# Altium footprint library Elements_LT.PcbLib: 145 footprints (part 3 of 10)
Each footprint in its own frame and in the unit in brackets; x right, y up, seen from the top. Pads: shape width x height; smd on the part's side, far side on the other; paste and mask are expansions set on the pad; w line width, h text height; cw(c..) or ccw(c..) is an arc to the next point about the centre after c.
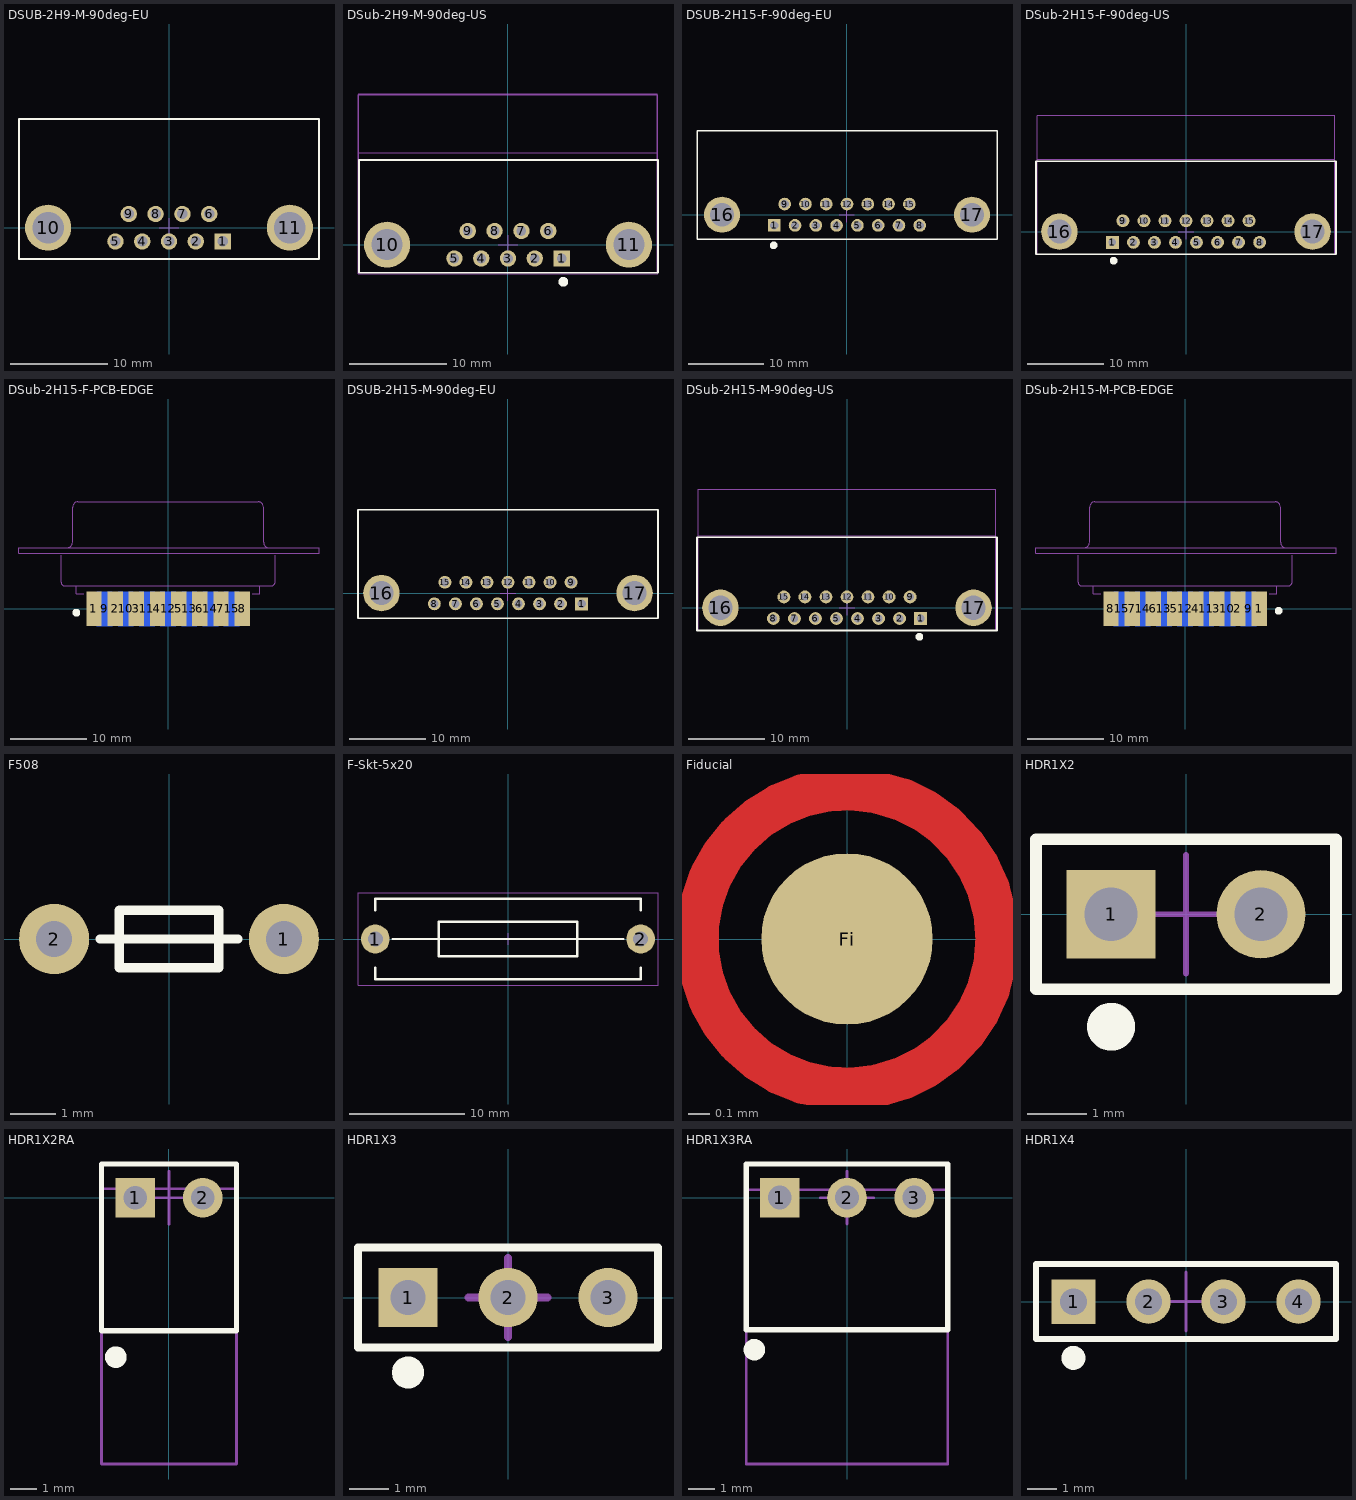
[diagram p2: the footprints below, top view; thin cyan lines are the x and y axes]

## DSUB-2H9-M-90deg-EU [mm] "Connector; D Subminiature; 9 Position; Right Angle; Pitch 1.385 mm; Male; EU"
height 12.75
pads (11):
  rect 1.69x1.69 hole 1.09: 1(5.54,-1.42)
  round 1.69 hole 1.09: 2(2.77,-1.42) 3(0,-1.42) 4(-2.77,-1.42) 5(-5.54,-1.42) 6(4.155,1.42) 7(1.385,1.42) 8(-1.385,1.42) 9(-4.155,1.42)
  round 4.76 hole 3.26: 10(-12.495,0) 11(12.495,0)
Top Overlay:
  lines w0.2: -15.5,-3.25 -15.5,11.25 15.5,11.25 15.5,-3.25 -15.5,-3.25
Mechanical 15:
  lines w0.1: -1,0 1,0 ; 0,-1 0,1
3D body "anschluss_a-ds_09_a_kg-t1.stp": height 12.56, standoff -4.31, extent -15.405,-3.1 15.405,17.8

## DSub-2H9-M-90deg-US [mm] "Connector; D Subminiature; 9 Position; Right Angle; Pitch 1.385 mm; Male; US"
height 12.75
pads (11):
  rect 1.69x1.69 hole 1: 1(5.54,-1.42)
  round 1.69 hole 1: 2(2.77,-1.42) 3(0,-1.42) 4(-2.77,-1.42) 5(-5.54,-1.42) 6(4.155,1.42) 7(1.385,1.42) 8(-1.385,1.42) 9(-4.155,1.42)
  round 4.76 hole 3.2: 10(-12.495,0) 11(12.495,0)
Top Overlay:
  circle w0.508: c5.715,-3.835 r0.254
  lines w0.2: -15.4,-2.9 15.5,-2.9 15.5,8.75 -15.4,8.75 -15.4,-2.9
Mechanical 13:
  lines w0.05: -15.405,-3 15.405,-3 15.405,15.6 -15.405,15.6 -15.405,-3
  lines w0.1: -15.405,9.5 15.405,9.5
Mechanical 15:
  lines w0.05: -15.5,-3 -15.5,15.5 15.5,15.5 15.5,-3 -15.5,-3
  lines w0.1: -1,0 1,0 ; 0,-1 0,1
3D body "anschluss_a-ds_09_a_kg-t2.stp": height 12.56, standoff -4.31, extent -15.405,-3 15.405,15.6

## DSUB-2H15-F-90deg-EU [mm] "Connector; D Subminiature; 15 Position; Right Angle; Pitch 1.385 mm; Female; EU"
height 12.75
pads (17):
  rect 1.69x1.69 hole 1.09: 1(-9.695,-1.42)
  round 1.69 hole 1.09: 2(-6.925,-1.42) 3(-4.155,-1.42) 4(-1.385,-1.42) 5(1.385,-1.42) 6(4.155,-1.42) 7(6.925,-1.42) 8(9.695,-1.42) 9(-8.31,1.42) 10(-5.54,1.42) 11(-2.77,1.42) 12(0,1.42) 13(2.77,1.42) 14(5.54,1.42) 15(8.31,1.42)
  round 4.8 hole 3.18: 16(-16.66,0) 17(16.66,0)
Top Overlay:
  circle w0.508: c-9.775,-4.085 r0.254
  lines w0.2: -20,-3.3 -20,11.2 20,11.2 20,-3.3 -20,-3.3
Mechanical 15:
  lines w0.1: -1,0 1,0 ; 0,-1 0,1
3D body "anschluss_a-df_15_a_kg-t1.stp": height 12.56, standoff -4.31, extent -19.57,-3.1 19.57,17.7

## DSub-2H15-F-90deg-US [mm] "Connector; D Subminiature; 15 Position; Right Angle; Pitch 1.385 mm; Female; US"
height 12.75
pads (17):
  rect 1.69x1.69 hole 1: 1(-9.695,-1.42)
  round 1.69 hole 1: 2(-6.925,-1.42) 3(-4.155,-1.42) 4(-1.385,-1.42) 5(1.385,-1.42) 6(4.155,-1.42) 7(6.925,-1.42) 8(9.695,-1.42) 9(-8.31,1.42) 10(-5.54,1.42) 11(-2.77,1.42) 12(0,1.42) 13(2.77,1.42) 14(5.54,1.42) 15(8.31,1.42)
  round 4.8 hole 3.2: 16(-16.66,0) 17(16.66,0)
Top Overlay:
  circle w0.508: c-9.525,-3.835 r0.254
  lines w0.2: -19.75,-3 -19.75,9.25 19.75,9.25 19.75,-3 -19.75,-3
Mechanical 13:
  lines w0.05: -19.57,15.23 -19.57,-3 19.57,-3 19.57,15.3 -19.57,15.3
  lines w0.1: -19.57,9.5 19.57,9.5 ; -19.57,15.23 -19.5,15.3
Mechanical 15:
  lines w0.1: -1,0 1,0 ; 0,-1 0,1
3D body "anschluss_a-df_15_a_kg-t2.stp": height 12.56, standoff -4.31, extent -19.57,-3 19.57,15.3

## DSub-2H15-F-PCB-EDGE [mm] "Connector; D Subminiature; 15 Position; PCB edge mount"
height 12.5
pads (15):
  rect 2x4.5 smd: 1(-9.695,0) 2(-6.925,0) 3(-4.155,0) 4(-1.385,0) 5(1.385,0) 6(4.155,0) 7(6.925,0) 8(9.695,0)
  rect 2x4.5 smd far side: 9(-8.31,0) 10(-5.54,0) 11(-2.77,0) 12(0,0) 13(2.77,0) 14(5.54,0) 15(8.31,0)
Top Overlay:
  circle w0.508: c-12,-0.5 r0.254
Mechanical 13:
  lines w0.1: -14,7 -14,3.5 ccw(c-13.5,3.5) -13.5,3 -12,3 ; -13.195,8.005 ccw(c-13.195,8.7) -12.5,8.7 -12.5,13.3 ; -12.495,13.305 cw(c-11.8,13.305) -11.8,14 11.8,14 cw(c11.8,13.305) 12.495,13.305 ; -11,2 -12,2 -12,3 ; 11,2 12,2 12,3 ; 12.5,13.3 12.5,8.7 ccw(c13.195,8.7) 13.195,8.005 ; 13.5,3 ccw(c13.5,3.5) 14,3.5 14,7 ; 13.506,3 12,3 ; -12,3 12,3 ; -19.5,7.25 19.75,7.25 19.75,8 -19.5,8 -19.5,7.25
Mechanical 15:
  lines w0.1: -1,0 1,0 ; 0,-1 0,1
3D body "c-5-747909-2-v-3d.stp": height 5.45, standoff -7.05, extent -19.7,-1 19.5,13.9

## DSUB-2H15-M-90deg-EU [mm] "Connector; D Subminiature; 15 Position; Right Angle; Pitch 1.385 mm; Male; EU"
height 12.75
pads (17):
  rect 1.69x1.69 hole 1.09: 1(9.695,-1.42)
  round 1.69 hole 1.09: 2(6.925,-1.42) 3(4.155,-1.42) 4(1.385,-1.42) 5(-1.385,-1.42) 6(-4.155,-1.42) 7(-6.925,-1.42) 8(-9.695,-1.42) 9(8.31,1.42) 10(5.54,1.42) 11(2.77,1.42) 12(0,1.42) 13(-2.77,1.42) 14(-5.54,1.42) 15(-8.31,1.42)
  round 4.8 hole 3.18: 16(-16.66,0) 17(16.66,0)
Top Overlay:
  lines w0.2: -19.75,-3.3 19.75,-3.3 19.75,10.95 -19.75,10.95 -19.75,-3.3
Mechanical 15:
  lines w0.1: -1,0 1,0 ; 0,-1 0,1
3D body "anschluss_a-ds_15_a_kg-t1.stp": height 12.56, standoff -4.31, extent -19.57,-3.1 19.57,17.8

## DSub-2H15-M-90deg-US [mm] "Connector; D Subminiature; 15 Position; Right Angle; Pitch 1.385 mm; Male; US"
height 12.75
pads (17):
  rect 1.69x1.69 hole 1: 1(9.695,-1.42)
  round 1.69 hole 1: 2(6.925,-1.42) 3(4.155,-1.42) 4(1.385,-1.42) 5(-1.385,-1.42) 6(-4.155,-1.42) 7(-6.925,-1.42) 8(-9.695,-1.42) 9(8.31,1.42) 10(5.54,1.42) 11(2.77,1.42) 12(0,1.42) 13(-2.77,1.42) 14(-5.54,1.42) 15(-8.31,1.42)
  round 4.8 hole 3.2: 16(-16.66,0) 17(16.66,0)
Top Overlay:
  circle w0.508: c9.525,-3.835 r0.254
  lines w0.2: -19.75,-3 -19.75,9.25 19.75,9.25 19.75,-3 -19.75,-3
Mechanical 13:
  lines w0.05: -19.57,-3 19.57,-3 19.57,15.6 -19.57,15.6 -19.57,-3
  lines w0.1: -19.57,9.5 19.57,9.5
Mechanical 15:
  lines w0.1: -1,0 1,0 ; 0,-1 0,1
3D body "anschluss_a-ds_15_a_kg-t2.stp": height 12.56, standoff -4.31, extent -19.57,-3 19.57,15.6

## DSub-2H15-M-PCB-EDGE [mm] "Connector; D Subminiature; 15 Position; PCB edge mount"
height 12.5
pads (15):
  rect 2x4.5 smd: 1(9.695,0) 2(6.925,0) 3(4.155,0) 4(1.385,0) 5(-1.385,0) 6(-4.155,0) 7(-6.925,0) 8(-9.695,0)
  rect 2x4.5 smd far side: 9(8.31,0) 10(5.54,0) 11(2.77,0) 12(0,0) 13(-2.77,0) 14(-5.54,0) 15(-8.31,0)
Top Overlay:
  circle w0.508: c12.25,-0.25 r0.254
Mechanical 13:
  lines w0.1: -14,7 -14,3.5 ccw(c-13.5,3.5) -13.5,3 -12,3 ; -13.195,8.005 ccw(c-13.195,8.7) -12.5,8.7 -12.5,13.3 ; -12.495,13.305 cw(c-11.8,13.305) -11.8,14 11.8,14 cw(c11.8,13.305) 12.495,13.305 ; -11,2 -12,2 -12,3 ; 11,2 12,2 12,3 ; 12.5,13.3 12.5,8.7 ccw(c13.195,8.7) 13.195,8.005 ; 13.5,3 ccw(c13.5,3.5) 14,3.5 14,7 ; 13.506,3 12,3 ; -12,3 12,3 ; -19.5,7.25 -19.5,8 19.75,8 19.75,7.25 -19.5,7.25
Mechanical 15:
  lines w0.1: -1,0 1,0 ; 0,-1 0,1
3D body "c-5-747908-2-w-3d.stp": height 5.45, standoff -7.05, extent -19.45,-1.225 19.75,14.225

## F508 [mm] "Fuse, THT, Pitch 5.08mm"
pads (2):
  round 1.55 hole 0.8 paste+0.025 mask+0.07: 1(2.54,0) 2(-2.54,0)
Top Overlay:
  lines w0.2: -1.524,0 1.524,0 ; -1.1,-0.635 1.1,-0.635 1.1,0.635 -1.1,0.635 -1.1,-0.635
3D body "User Library-CAP CERAMICO.STEP": height 4.8, standoff -0.68, extent -2.68,-1.041 2.68,1.059

## F-Skt-5x20 [mm] "Socket, THT, for fuse 5x20 mm"
height 12.7
pads (2):
  round 2.5 hole 1.3 paste+0.025 mask+0.07: 1(-11.5,0) 2(11.5,0)
Top Overlay:
  lines w0.2: -11.5,-2.5 -11.5,-3.5 11.5,-3.5 11.5,-2.5 ; -11.5,2.5 -11.5,3.5 11.5,3.5 11.5,2.5 ; -10,0 10,0 ; -6,-1.5 -6,1.5 6,1.5 6,-1.5 -6,-1.5
Mechanical 15:
  lines w0.05: -13,-4 -13,4 13,4 13,-4 -13,-4
  lines w0.1: -0.5,0 0.5,0 ; 0,-0.5 0,0.5
3D body: height 12.7, standoff 0, extent -11.5,-4 11.5,4

## Fiducial [mm] "Fiducial"
pads (1):
  round 0.8 smd: Fi(0,0)
Top Layer:
  circle w0.2: c0,0 r0.7

## HDR1X2 [mm] "Connector; Header; 2 Position"
pads (2):
  rect 1.5x1.5 hole 0.9: 1(-1.27,0)
  round 1.5 hole 0.9: 2(1.27,0)
Top Overlay:
  circle w0.406: c-1.27,-1.905 r0.203
  lines w0.2: -2.54,-1.27 -2.54,1.27 2.54,1.27 2.54,-1.27 -2.54,-1.27
Mechanical 15:
  lines w0.1: -1,0 1,0 ; 0,-1 0,1
3D body "Download_STP_61300211121 (rev1).stp": height 8.77, standoff -2.77, extent -2.54,-1.27 2.54,1.27

## HDR1X2RA [mm] "Connector; Header; 2 Position; Right Angle"
pads (2):
  rect 1.5x1.5 hole 0.9: 1(-1.27,0)
  round 1.5 hole 0.9: 2(1.27,0)
Top Overlay:
  circle w0.406: c-2,-6 r0.203
  lines w0.2: -2.54,-5 2.54,-5 2.54,1.27 -2.54,1.27 -2.54,-5
Mechanical 13:
  lines w0.1: -2.54,-10.02 2.54,-10.02 2.54,0.34 -2.54,0.34 -2.54,-10.02
Mechanical 15:
  lines w0.1: -1,0 1,0 ; 0,-1 0,1
3D body "61300211021 (rev1).stp": height 2.77, standoff -2.77, extent -2.54,-10.02 2.54,0.34

## HDR1X3 [mm] "Connector; Header; 3 Position"
pads (3):
  rect 1.5x1.5 hole 0.9: 1(-2.54,0)
  round 1.5 hole 0.9: 2(0,0) 3(2.54,0)
Top Overlay:
  circle w0.406: c-2.54,-1.905 r0.203
  lines w0.2: -3.81,-1.27 3.81,-1.27 3.81,1.27 -3.81,1.27 -3.81,-1.27
Mechanical 15:
  lines w0.2: -1,0 1,0 ; 0,-1 0,1
3D body "Download_STP_61300311121 (rev1).stp": height 8.77, standoff -2.77, extent -3.81,-1.27 3.81,1.27

## HDR1X3RA [mm] "Connector; Header; 3 Position; Right Angle"
pads (3):
  rect 1.5x1.5 hole 0.9: 1(-2.54,0)
  round 1.5 hole 0.9: 2(0,0) 3(2.54,0)
Top Overlay:
  circle w0.406: c-3.5,-5.75 r0.203
  lines w0.2: -3.81,-5 3.81,-5 3.81,1.27 -3.81,1.27 -3.81,-5
Mechanical 13:
  lines w0.1: -3.81,-10.07 -3.81,0.29 3.81,0.29 3.81,-10.07 -3.81,-10.07
Mechanical 15:
  lines w0.1: -1,0 1,0 ; 0,-1 0,1
3D body "61300311021 (rev1).stp": height 2.77, standoff -2.77, extent -3.81,-10.07 3.81,0.29

## HDR1X4 [mm] "Connector; Header; 4 Position"
pads (4):
  rect 1.5x1.5 hole 0.9: 1(-3.81,0)
  round 1.5 hole 0.9: 2(-1.27,0) 3(1.27,0) 4(3.81,0)
Top Overlay:
  circle w0.406: c-3.81,-1.905 r0.203
  lines w0.2: -5.08,-1.27 5.08,-1.27 5.08,1.27 -5.08,1.27 -5.08,-1.27
Mechanical 15:
  lines w0.1: -1,0 1,0 ; 0,-1 0,1
3D body "Download_STP_61300211121 (rev1).stp": height 8.77, standoff -2.77, extent 0,-1.27 5.08,1.27
3D body "Download_STP_61300211121 (rev1).stp": height 8.77, standoff -2.77, extent -5.08,-1.27 0,1.27